# Altium schematic symbol library SparkFun-Aesthetics.SCHLIB: 129 symbols (continued)
## SFE_LOGO_FLAME.2COP (continued)
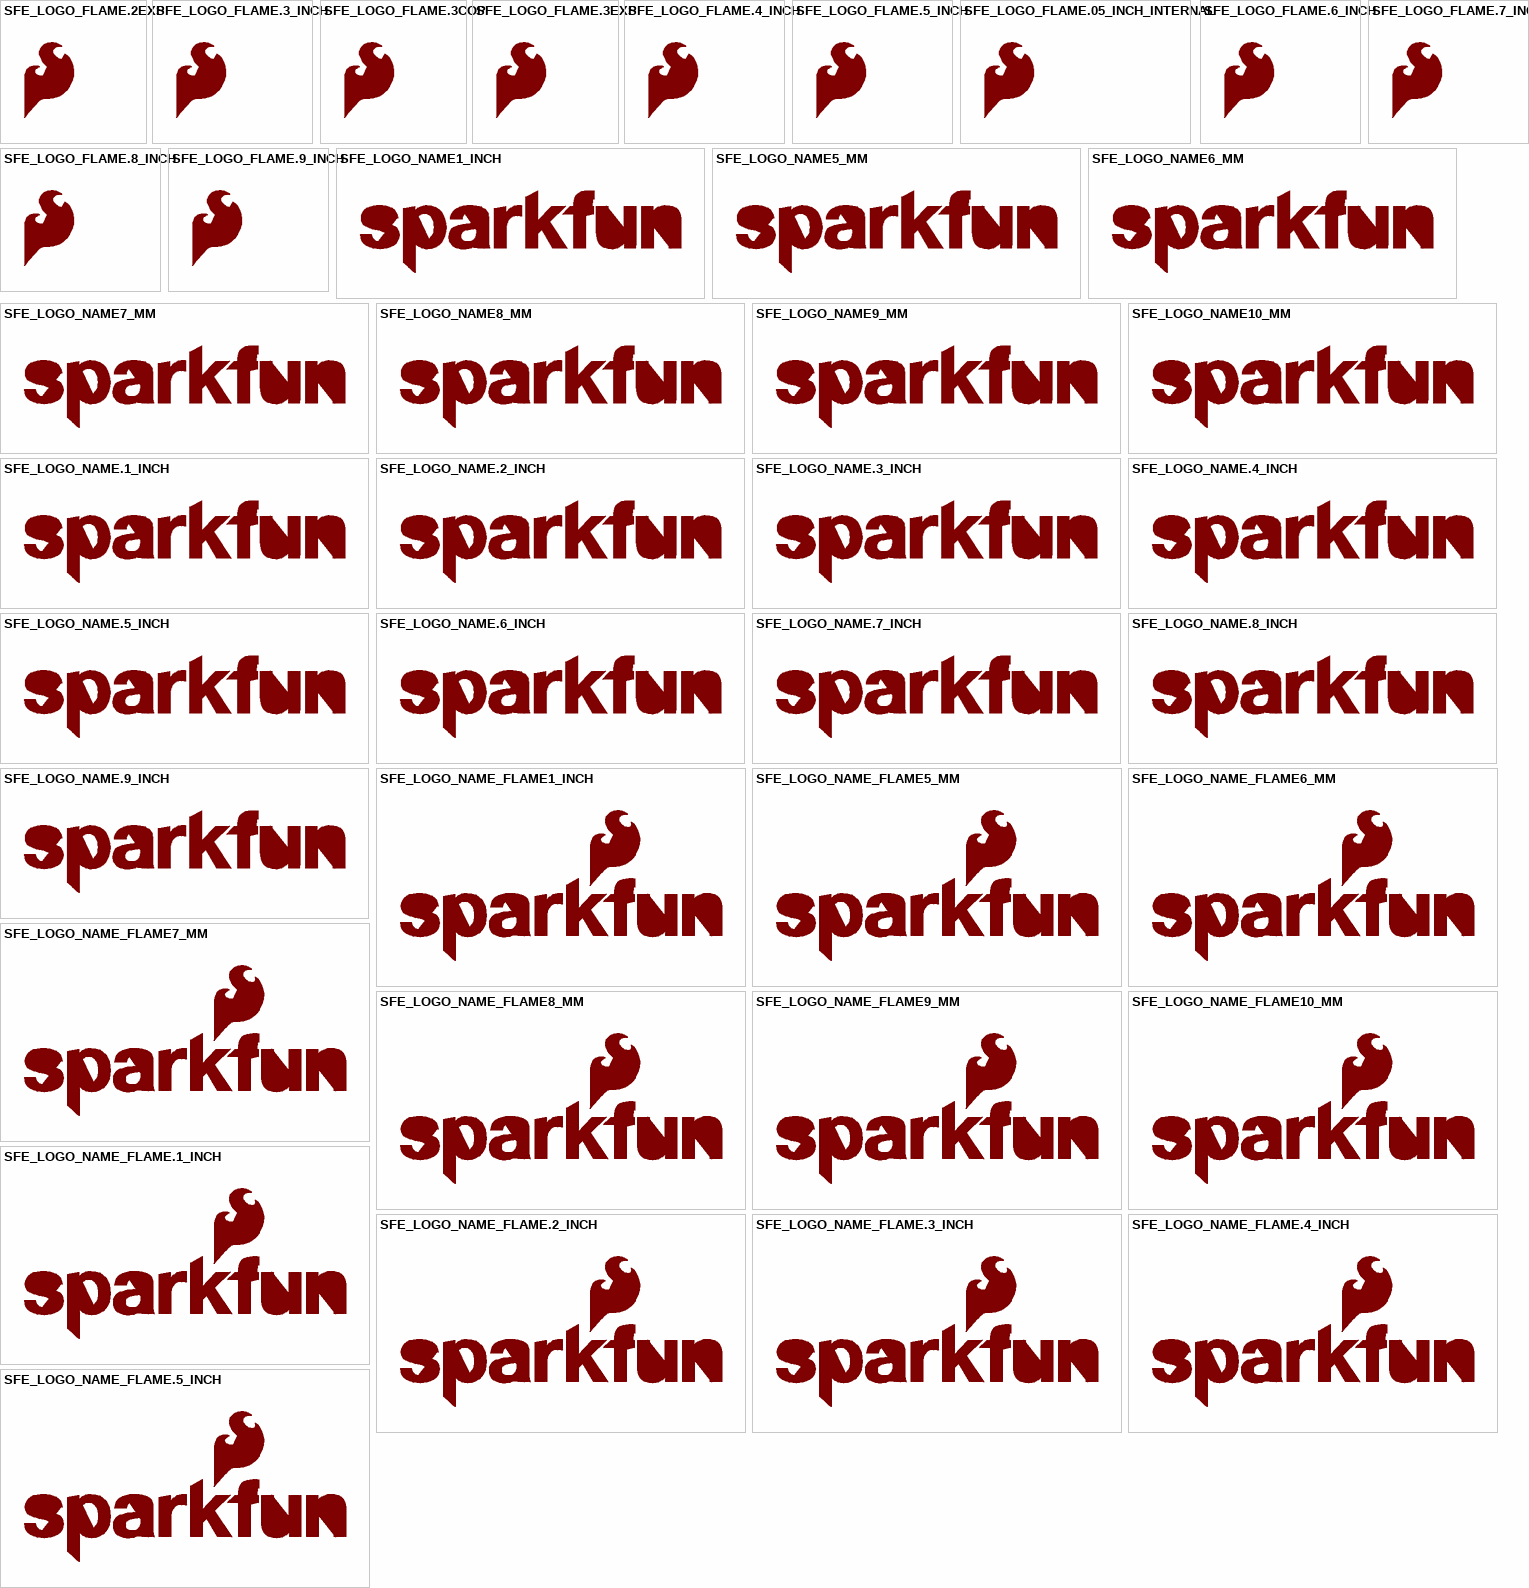
[diagram p10: symbols SFE_LOGO_FLAME.2EXP to SFE_LOGO_NAME_FLAME.5_INCH]

## SFE_LOGO_FLAME.2EXP
designator LOGO?, comment SparkFun Flame Logo    This is the SparkFun flame logo. The logo on the schematic will always be the same size; the package variant is the height of the flame. Default layer for the logo on the board is tSilk.  (value not drawn)
GateName_1: G$1; SymbolName_1: SFE_LOGO_FLAME; DeviceName: .2EXP; LibraryName: SparkFun-Aesthetics; DeviceSetName: SFE_LOGO_FLAME; Package: SFE_LOGO_FLAME_COPPER_EXPOSED_.2
footprint SFE_LOGO_FLAME_COPPER_EXPOSED_.2

## SFE_LOGO_FLAME.3_INCH
designator LOGO?, comment SparkFun Flame Logo    This is the SparkFun flame logo. The logo on the schematic will always be the same size; the package variant is the height of the flame. Default layer for the logo on the board is tSilk.  (value not drawn)
GateName_1: G$1; SymbolName_1: SFE_LOGO_FLAME; DeviceName: .3_INCH; LibraryName: SparkFun-Aesthetics; DeviceSetName: SFE_LOGO_FLAME; Package: SFE_LOGO_FLAME_.3
footprint SFE_LOGO_FLAME_.3

## SFE_LOGO_FLAME.3COP
designator LOGO?, comment SparkFun Flame Logo    This is the SparkFun flame logo. The logo on the schematic will always be the same size; the package variant is the height of the flame. Default layer for the logo on the board is tSilk.  (value not drawn)
GateName_1: G$1; SymbolName_1: SFE_LOGO_FLAME; DeviceName: .3COP; LibraryName: SparkFun-Aesthetics; DeviceSetName: SFE_LOGO_FLAME; Package: SFE_LOGO_FLAME_COPPER_.3
footprint SFE_LOGO_FLAME_COPPER_.3

## SFE_LOGO_FLAME.3EXP
designator LOGO?, comment SparkFun Flame Logo    This is the SparkFun flame logo. The logo on the schematic will always be the same size; the package variant is the height of the flame. Default layer for the logo on the board is tSilk.  (value not drawn)
GateName_1: G$1; SymbolName_1: SFE_LOGO_FLAME; DeviceName: .3EXP; LibraryName: SparkFun-Aesthetics; DeviceSetName: SFE_LOGO_FLAME; Package: SFE_LOGO_FLAME_COPPER_EXPOSED_.3
footprint SFE_LOGO_FLAME_COPPER_EXPOSED_.3

## SFE_LOGO_FLAME.4_INCH
designator LOGO?, comment SparkFun Flame Logo    This is the SparkFun flame logo. The logo on the schematic will always be the same size; the package variant is the height of the flame. Default layer for the logo on the board is tSilk.  (value not drawn)
GateName_1: G$1; SymbolName_1: SFE_LOGO_FLAME; DeviceName: .4_INCH; LibraryName: SparkFun-Aesthetics; DeviceSetName: SFE_LOGO_FLAME; Package: SFE_LOGO_FLAME_.4
footprint SFE_LOGO_FLAME_.4

## SFE_LOGO_FLAME.5_INCH
designator LOGO?, comment SparkFun Flame Logo    This is the SparkFun flame logo. The logo on the schematic will always be the same size; the package variant is the height of the flame. Default layer for the logo on the board is tSilk.  (value not drawn)
GateName_1: G$1; SymbolName_1: SFE_LOGO_FLAME; DeviceName: .5_INCH; LibraryName: SparkFun-Aesthetics; DeviceSetName: SFE_LOGO_FLAME; Package: SFE_LOGO_FLAME_.5
footprint SFE_LOGO_FLAME_.5

## SFE_LOGO_FLAME.05_INCH_INTERNAL
designator LOGO?, comment SparkFun Flame Logo    This is the SparkFun flame logo. The logo on the schematic will always be the same size; the package variant is the height of the flame. Default layer for the logo on the board is tSilk.  (value not drawn)
GateName_1: G$1; SymbolName_1: SFE_LOGO_FLAME; DeviceName: .05_INCH_INTERNAL; LibraryName: SparkFun-Aesthetics; DeviceSetName: SFE_LOGO_FLAME; Package: SFE_LOGO_FLAME_INTERNAL_0.05
footprint SFE_LOGO_FLAME_INTERNAL_0.05

## SFE_LOGO_FLAME.6_INCH
designator LOGO?, comment SparkFun Flame Logo    This is the SparkFun flame logo. The logo on the schematic will always be the same size; the package variant is the height of the flame. Default layer for the logo on the board is tSilk.  (value not drawn)
GateName_1: G$1; SymbolName_1: SFE_LOGO_FLAME; DeviceName: .6_INCH; LibraryName: SparkFun-Aesthetics; DeviceSetName: SFE_LOGO_FLAME; Package: SFE_LOGO_FLAME_.6
footprint SFE_LOGO_FLAME_.6

## SFE_LOGO_FLAME.7_INCH
designator LOGO?, comment SparkFun Flame Logo    This is the SparkFun flame logo. The logo on the schematic will always be the same size; the package variant is the height of the flame. Default layer for the logo on the board is tSilk.  (value not drawn)
GateName_1: G$1; SymbolName_1: SFE_LOGO_FLAME; DeviceName: .7_INCH; LibraryName: SparkFun-Aesthetics; DeviceSetName: SFE_LOGO_FLAME; Package: SFE_LOGO_FLAME_.7
footprint SFE_LOGO_FLAME_.7

## SFE_LOGO_FLAME.8_INCH
designator LOGO?, comment SparkFun Flame Logo    This is the SparkFun flame logo. The logo on the schematic will always be the same size; the package variant is the height of the flame. Default layer for the logo on the board is tSilk.  (value not drawn)
GateName_1: G$1; SymbolName_1: SFE_LOGO_FLAME; DeviceName: .8_INCH; LibraryName: SparkFun-Aesthetics; DeviceSetName: SFE_LOGO_FLAME; Package: SFE_LOGO_FLAME_.8
footprint SFE_LOGO_FLAME_.8

## SFE_LOGO_FLAME.9_INCH
designator LOGO?, comment SparkFun Flame Logo    This is the SparkFun flame logo. The logo on the schematic will always be the same size; the package variant is the height of the flame. Default layer for the logo on the board is tSilk.  (value not drawn)
GateName_1: G$1; SymbolName_1: SFE_LOGO_FLAME; DeviceName: .9_INCH; LibraryName: SparkFun-Aesthetics; DeviceSetName: SFE_LOGO_FLAME; Package: SFE_LOGO_FLAME_.9
footprint SFE_LOGO_FLAME_.9

## SFE_LOGO_NAME1_INCH
designator LOGO?, comment SparkFun Font Logo    This is the SparkFun name logo. The logo on the schematic will always be the same size; the package variant is the height of the flame part of the logo (or the height the flame would be, if it were drawn). Default layer for the logo on the board is tSilk.  (value not drawn)
GateName_1: G$1; SymbolName_1: SFE_LOGO_NAME; DeviceName: 1_INCH; LibraryName: SparkFun-Aesthetics; DeviceSetName: SFE_LOGO_NAME; Package: SFE_LOGO_NAME_1
footprint SFE_LOGO_NAME_1

## SFE_LOGO_NAME5_MM
designator LOGO?, comment SparkFun Font Logo    This is the SparkFun name logo. The logo on the schematic will always be the same size; the package variant is the height of the flame part of the logo (or the height the flame would be, if it were drawn). Default layer for the logo on the board is tSilk.  (value not drawn)
GateName_1: G$1; SymbolName_1: SFE_LOGO_NAME; DeviceName: 5_MM; LibraryName: SparkFun-Aesthetics; DeviceSetName: SFE_LOGO_NAME; Package: SFE_LOGO_NAME_5MM
footprint SFE_LOGO_NAME_5MM

## SFE_LOGO_NAME6_MM
designator LOGO?, comment SparkFun Font Logo    This is the SparkFun name logo. The logo on the schematic will always be the same size; the package variant is the height of the flame part of the logo (or the height the flame would be, if it were drawn). Default layer for the logo on the board is tSilk.  (value not drawn)
GateName_1: G$1; SymbolName_1: SFE_LOGO_NAME; DeviceName: 6_MM; LibraryName: SparkFun-Aesthetics; DeviceSetName: SFE_LOGO_NAME; Package: SFE_LOGO_NAME_6MM
footprint SFE_LOGO_NAME_6MM

## SFE_LOGO_NAME7_MM
designator LOGO?, comment SparkFun Font Logo    This is the SparkFun name logo. The logo on the schematic will always be the same size; the package variant is the height of the flame part of the logo (or the height the flame would be, if it were drawn). Default layer for the logo on the board is tSilk.  (value not drawn)
GateName_1: G$1; SymbolName_1: SFE_LOGO_NAME; DeviceName: 7_MM; LibraryName: SparkFun-Aesthetics; DeviceSetName: SFE_LOGO_NAME; Package: SFE_LOGO_NAME_7MM
footprint SFE_LOGO_NAME_7MM

## SFE_LOGO_NAME8_MM
designator LOGO?, comment SparkFun Font Logo    This is the SparkFun name logo. The logo on the schematic will always be the same size; the package variant is the height of the flame part of the logo (or the height the flame would be, if it were drawn). Default layer for the logo on the board is tSilk.  (value not drawn)
GateName_1: G$1; SymbolName_1: SFE_LOGO_NAME; DeviceName: 8_MM; LibraryName: SparkFun-Aesthetics; DeviceSetName: SFE_LOGO_NAME; Package: SFE_LOGO_NAME_8MM
footprint SFE_LOGO_NAME_8MM

## SFE_LOGO_NAME9_MM
designator LOGO?, comment SparkFun Font Logo    This is the SparkFun name logo. The logo on the schematic will always be the same size; the package variant is the height of the flame part of the logo (or the height the flame would be, if it were drawn). Default layer for the logo on the board is tSilk.  (value not drawn)
GateName_1: G$1; SymbolName_1: SFE_LOGO_NAME; DeviceName: 9_MM; LibraryName: SparkFun-Aesthetics; DeviceSetName: SFE_LOGO_NAME; Package: SFE_LOGO_NAME_9MM
footprint SFE_LOGO_NAME_9MM

## SFE_LOGO_NAME10_MM
designator LOGO?, comment SparkFun Font Logo    This is the SparkFun name logo. The logo on the schematic will always be the same size; the package variant is the height of the flame part of the logo (or the height the flame would be, if it were drawn). Default layer for the logo on the board is tSilk.  (value not drawn)
GateName_1: G$1; SymbolName_1: SFE_LOGO_NAME; DeviceName: 10_MM; LibraryName: SparkFun-Aesthetics; DeviceSetName: SFE_LOGO_NAME; Package: SFE_LOGO_NAME_10MM
footprint SFE_LOGO_NAME_10MM

## SFE_LOGO_NAME.1_INCH
designator LOGO?, comment SparkFun Font Logo    This is the SparkFun name logo. The logo on the schematic will always be the same size; the package variant is the height of the flame part of the logo (or the height the flame would be, if it were drawn). Default layer for the logo on the board is tSilk.  (value not drawn)
GateName_1: G$1; SymbolName_1: SFE_LOGO_NAME; DeviceName: .1_INCH; LibraryName: SparkFun-Aesthetics; DeviceSetName: SFE_LOGO_NAME; Package: SFE_LOGO_NAME_.1
footprint SFE_LOGO_NAME_.1

## SFE_LOGO_NAME.2_INCH
designator LOGO?, comment SparkFun Font Logo    This is the SparkFun name logo. The logo on the schematic will always be the same size; the package variant is the height of the flame part of the logo (or the height the flame would be, if it were drawn). Default layer for the logo on the board is tSilk.  (value not drawn)
GateName_1: G$1; SymbolName_1: SFE_LOGO_NAME; DeviceName: .2_INCH; LibraryName: SparkFun-Aesthetics; DeviceSetName: SFE_LOGO_NAME; Package: SFE_LOGO_NAME_.2
footprint SFE_LOGO_NAME_.2

## SFE_LOGO_NAME.3_INCH
designator LOGO?, comment SparkFun Font Logo    This is the SparkFun name logo. The logo on the schematic will always be the same size; the package variant is the height of the flame part of the logo (or the height the flame would be, if it were drawn). Default layer for the logo on the board is tSilk.  (value not drawn)
GateName_1: G$1; SymbolName_1: SFE_LOGO_NAME; DeviceName: .3_INCH; LibraryName: SparkFun-Aesthetics; DeviceSetName: SFE_LOGO_NAME; Package: SFE_LOGO_NAME_.3
footprint SFE_LOGO_NAME_.3

## SFE_LOGO_NAME.4_INCH
designator LOGO?, comment SparkFun Font Logo    This is the SparkFun name logo. The logo on the schematic will always be the same size; the package variant is the height of the flame part of the logo (or the height the flame would be, if it were drawn). Default layer for the logo on the board is tSilk.  (value not drawn)
GateName_1: G$1; SymbolName_1: SFE_LOGO_NAME; DeviceName: .4_INCH; LibraryName: SparkFun-Aesthetics; DeviceSetName: SFE_LOGO_NAME; Package: SFE_LOGO_NAME_.4
footprint SFE_LOGO_NAME_.4

## SFE_LOGO_NAME.5_INCH
designator LOGO?, comment SparkFun Font Logo    This is the SparkFun name logo. The logo on the schematic will always be the same size; the package variant is the height of the flame part of the logo (or the height the flame would be, if it were drawn). Default layer for the logo on the board is tSilk.  (value not drawn)
GateName_1: G$1; SymbolName_1: SFE_LOGO_NAME; DeviceName: .5_INCH; LibraryName: SparkFun-Aesthetics; DeviceSetName: SFE_LOGO_NAME; Package: SFE_LOGO_NAME_.5
footprint SFE_LOGO_NAME_.5

## SFE_LOGO_NAME.6_INCH
designator LOGO?, comment SparkFun Font Logo    This is the SparkFun name logo. The logo on the schematic will always be the same size; the package variant is the height of the flame part of the logo (or the height the flame would be, if it were drawn). Default layer for the logo on the board is tSilk.  (value not drawn)
GateName_1: G$1; SymbolName_1: SFE_LOGO_NAME; DeviceName: .6_INCH; LibraryName: SparkFun-Aesthetics; DeviceSetName: SFE_LOGO_NAME; Package: SFE_LOGO_NAME_.6
footprint SFE_LOGO_NAME_.6

## SFE_LOGO_NAME.7_INCH
designator LOGO?, comment SparkFun Font Logo    This is the SparkFun name logo. The logo on the schematic will always be the same size; the package variant is the height of the flame part of the logo (or the height the flame would be, if it were drawn). Default layer for the logo on the board is tSilk.  (value not drawn)
GateName_1: G$1; SymbolName_1: SFE_LOGO_NAME; DeviceName: .7_INCH; LibraryName: SparkFun-Aesthetics; DeviceSetName: SFE_LOGO_NAME; Package: SFE_LOGO_NAME_.7
footprint SFE_LOGO_NAME_.7

## SFE_LOGO_NAME.8_INCH
designator LOGO?, comment SparkFun Font Logo    This is the SparkFun name logo. The logo on the schematic will always be the same size; the package variant is the height of the flame part of the logo (or the height the flame would be, if it were drawn). Default layer for the logo on the board is tSilk.  (value not drawn)
GateName_1: G$1; SymbolName_1: SFE_LOGO_NAME; DeviceName: .8_INCH; LibraryName: SparkFun-Aesthetics; DeviceSetName: SFE_LOGO_NAME; Package: SFE_LOGO_NAME_.8
footprint SFE_LOGO_NAME_.8

## SFE_LOGO_NAME.9_INCH
designator LOGO?, comment SparkFun Font Logo    This is the SparkFun name logo. The logo on the schematic will always be the same size; the package variant is the height of the flame part of the logo (or the height the flame would be, if it were drawn). Default layer for the logo on the board is tSilk.  (value not drawn)
GateName_1: G$1; SymbolName_1: SFE_LOGO_NAME; DeviceName: .9_INCH; LibraryName: SparkFun-Aesthetics; DeviceSetName: SFE_LOGO_NAME; Package: SFE_LOGO_NAME_.9
footprint SFE_LOGO_NAME_.9

## SFE_LOGO_NAME_FLAME1_INCH
designator LOGO?, comment SparkFun Font Logo w/ Flame    This is the SparkFun full logo. The logo on the schematic will always be the same size; the package variant is the height of the flame part of the logo. Default layer for the logo on the board is tSilk.  (value not drawn)
GateName_1: G$1; SymbolName_1: SFE_LOGO_NAME_FLAME; DeviceName: 1_INCH; LibraryName: SparkFun-Aesthetics; DeviceSetName: SFE_LOGO_NAME_FLAME; Package: SFE_LOGO_NAME_FLAME_1
footprint SFE_LOGO_NAME_FLAME_1

## SFE_LOGO_NAME_FLAME5_MM
designator LOGO?, comment SparkFun Font Logo w/ Flame    This is the SparkFun full logo. The logo on the schematic will always be the same size; the package variant is the height of the flame part of the logo. Default layer for the logo on the board is tSilk.  (value not drawn)
GateName_1: G$1; SymbolName_1: SFE_LOGO_NAME_FLAME; DeviceName: 5_MM; LibraryName: SparkFun-Aesthetics; DeviceSetName: SFE_LOGO_NAME_FLAME; Package: SFE_LOGO_NAME_FLAME_5MM
footprint SFE_LOGO_NAME_FLAME_5MM

## SFE_LOGO_NAME_FLAME6_MM
designator LOGO?, comment SparkFun Font Logo w/ Flame    This is the SparkFun full logo. The logo on the schematic will always be the same size; the package variant is the height of the flame part of the logo. Default layer for the logo on the board is tSilk.  (value not drawn)
GateName_1: G$1; SymbolName_1: SFE_LOGO_NAME_FLAME; DeviceName: 6_MM; LibraryName: SparkFun-Aesthetics; DeviceSetName: SFE_LOGO_NAME_FLAME; Package: SFE_LOGO_NAME_FLAME_6MM
footprint SFE_LOGO_NAME_FLAME_6MM

## SFE_LOGO_NAME_FLAME7_MM
designator LOGO?, comment SparkFun Font Logo w/ Flame    This is the SparkFun full logo. The logo on the schematic will always be the same size; the package variant is the height of the flame part of the logo. Default layer for the logo on the board is tSilk.  (value not drawn)
GateName_1: G$1; SymbolName_1: SFE_LOGO_NAME_FLAME; DeviceName: 7_MM; LibraryName: SparkFun-Aesthetics; DeviceSetName: SFE_LOGO_NAME_FLAME; Package: SFE_LOGO_NAME_FLAME_7MM
footprint SFE_LOGO_NAME_FLAME_7MM

## SFE_LOGO_NAME_FLAME8_MM
designator LOGO?, comment SparkFun Font Logo w/ Flame    This is the SparkFun full logo. The logo on the schematic will always be the same size; the package variant is the height of the flame part of the logo. Default layer for the logo on the board is tSilk.  (value not drawn)
GateName_1: G$1; SymbolName_1: SFE_LOGO_NAME_FLAME; DeviceName: 8_MM; LibraryName: SparkFun-Aesthetics; DeviceSetName: SFE_LOGO_NAME_FLAME; Package: SFE_LOGO_NAME_FLAME_8MM
footprint SFE_LOGO_NAME_FLAME_8MM

## SFE_LOGO_NAME_FLAME9_MM
designator LOGO?, comment SparkFun Font Logo w/ Flame    This is the SparkFun full logo. The logo on the schematic will always be the same size; the package variant is the height of the flame part of the logo. Default layer for the logo on the board is tSilk.  (value not drawn)
GateName_1: G$1; SymbolName_1: SFE_LOGO_NAME_FLAME; DeviceName: 9_MM; LibraryName: SparkFun-Aesthetics; DeviceSetName: SFE_LOGO_NAME_FLAME; Package: SFE_LOGO_NAME_FLAME_9MM
footprint SFE_LOGO_NAME_FLAME_9MM

## SFE_LOGO_NAME_FLAME10_MM
designator LOGO?, comment SparkFun Font Logo w/ Flame    This is the SparkFun full logo. The logo on the schematic will always be the same size; the package variant is the height of the flame part of the logo. Default layer for the logo on the board is tSilk.  (value not drawn)
GateName_1: G$1; SymbolName_1: SFE_LOGO_NAME_FLAME; DeviceName: 10_MM; LibraryName: SparkFun-Aesthetics; DeviceSetName: SFE_LOGO_NAME_FLAME; Package: SFE_LOGO_NAME_FLAME_10MM
footprint SFE_LOGO_NAME_FLAME_10MM

## SFE_LOGO_NAME_FLAME.1_INCH
designator LOGO?, comment SparkFun Font Logo w/ Flame    This is the SparkFun full logo. The logo on the schematic will always be the same size; the package variant is the height of the flame part of the logo. Default layer for the logo on the board is tSilk.  (value not drawn)
GateName_1: G$1; SymbolName_1: SFE_LOGO_NAME_FLAME; DeviceName: .1_INCH; LibraryName: SparkFun-Aesthetics; DeviceSetName: SFE_LOGO_NAME_FLAME; Package: SFE_LOGO_NAME_FLAME_.1
footprint SFE_LOGO_NAME_FLAME_.1

## SFE_LOGO_NAME_FLAME.2_INCH
designator LOGO?, comment SparkFun Font Logo w/ Flame    This is the SparkFun full logo. The logo on the schematic will always be the same size; the package variant is the height of the flame part of the logo. Default layer for the logo on the board is tSilk.  (value not drawn)
GateName_1: G$1; SymbolName_1: SFE_LOGO_NAME_FLAME; DeviceName: .2_INCH; LibraryName: SparkFun-Aesthetics; DeviceSetName: SFE_LOGO_NAME_FLAME; Package: SFE_LOGO_NAME_FLAME_.2
footprint SFE_LOGO_NAME_FLAME_.2

## SFE_LOGO_NAME_FLAME.3_INCH
designator LOGO?, comment SparkFun Font Logo w/ Flame    This is the SparkFun full logo. The logo on the schematic will always be the same size; the package variant is the height of the flame part of the logo. Default layer for the logo on the board is tSilk.  (value not drawn)
GateName_1: G$1; SymbolName_1: SFE_LOGO_NAME_FLAME; DeviceName: .3_INCH; LibraryName: SparkFun-Aesthetics; DeviceSetName: SFE_LOGO_NAME_FLAME; Package: SFE_LOGO_NAME_FLAME_.3
footprint SFE_LOGO_NAME_FLAME_.3

## SFE_LOGO_NAME_FLAME.4_INCH
designator LOGO?, comment SparkFun Font Logo w/ Flame    This is the SparkFun full logo. The logo on the schematic will always be the same size; the package variant is the height of the flame part of the logo. Default layer for the logo on the board is tSilk.  (value not drawn)
GateName_1: G$1; SymbolName_1: SFE_LOGO_NAME_FLAME; DeviceName: .4_INCH; LibraryName: SparkFun-Aesthetics; DeviceSetName: SFE_LOGO_NAME_FLAME; Package: SFE_LOGO_NAME_FLAME_.4
footprint SFE_LOGO_NAME_FLAME_.4

## SFE_LOGO_NAME_FLAME.5_INCH
designator LOGO?, comment SparkFun Font Logo w/ Flame    This is the SparkFun full logo. The logo on the schematic will always be the same size; the package variant is the height of the flame part of the logo. Default layer for the logo on the board is tSilk.  (value not drawn)
GateName_1: G$1; SymbolName_1: SFE_LOGO_NAME_FLAME; DeviceName: .5_INCH; LibraryName: SparkFun-Aesthetics; DeviceSetName: SFE_LOGO_NAME_FLAME; Package: SFE_LOGO_NAME_FLAME_.5
footprint SFE_LOGO_NAME_FLAME_.5

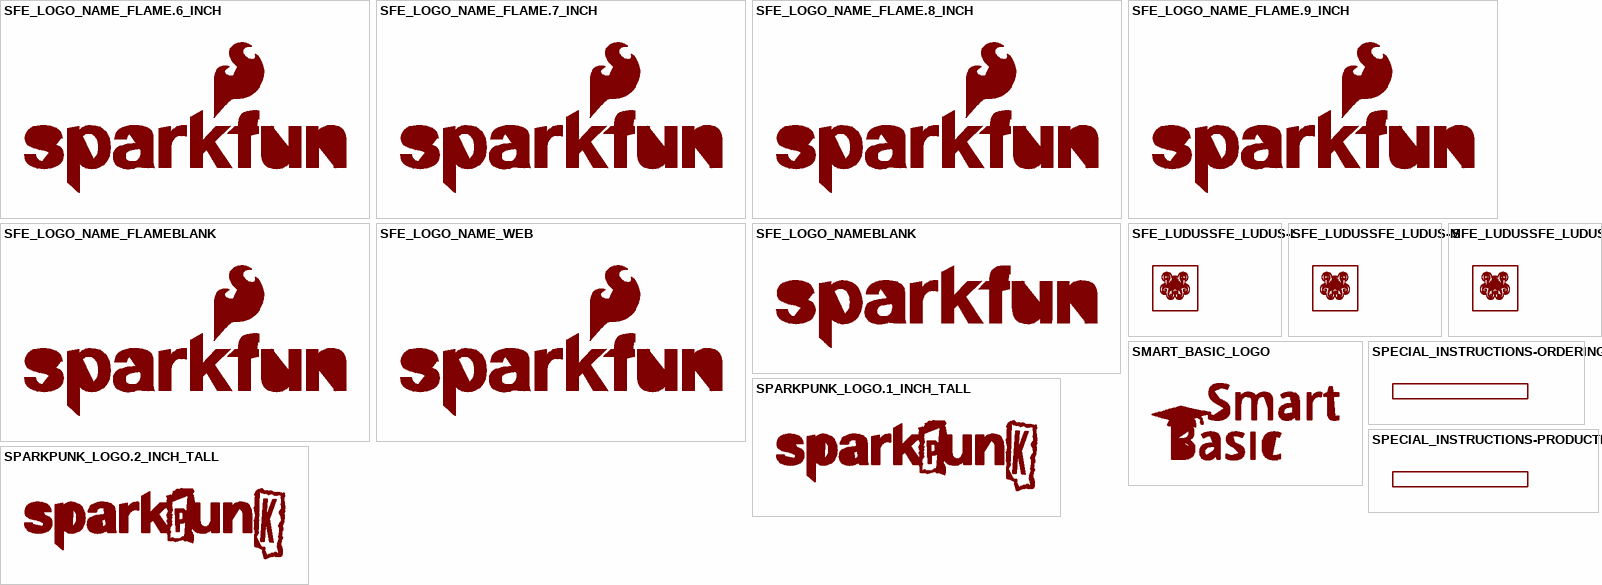
[diagram p11: symbols SFE_LOGO_NAME_FLAME.6_INCH to SPECIAL_INSTRUCTIONS-PRODUCTION]

## SFE_LOGO_NAME_FLAME.6_INCH
designator LOGO?, comment SparkFun Font Logo w/ Flame    This is the SparkFun full logo. The logo on the schematic will always be the same size; the package variant is the height of the flame part of the logo. Default layer for the logo on the board is tSilk.  (value not drawn)
GateName_1: G$1; SymbolName_1: SFE_LOGO_NAME_FLAME; DeviceName: .6_INCH; LibraryName: SparkFun-Aesthetics; DeviceSetName: SFE_LOGO_NAME_FLAME; Package: SFE_LOGO_NAME_FLAME_.6
footprint SFE_LOGO_NAME_FLAME_.6

## SFE_LOGO_NAME_FLAME.7_INCH
designator LOGO?, comment SparkFun Font Logo w/ Flame    This is the SparkFun full logo. The logo on the schematic will always be the same size; the package variant is the height of the flame part of the logo. Default layer for the logo on the board is tSilk.  (value not drawn)
GateName_1: G$1; SymbolName_1: SFE_LOGO_NAME_FLAME; DeviceName: .7_INCH; LibraryName: SparkFun-Aesthetics; DeviceSetName: SFE_LOGO_NAME_FLAME; Package: SFE_LOGO_NAME_FLAME_.7
footprint SFE_LOGO_NAME_FLAME_.7

## SFE_LOGO_NAME_FLAME.8_INCH
designator LOGO?, comment SparkFun Font Logo w/ Flame    This is the SparkFun full logo. The logo on the schematic will always be the same size; the package variant is the height of the flame part of the logo. Default layer for the logo on the board is tSilk.  (value not drawn)
GateName_1: G$1; SymbolName_1: SFE_LOGO_NAME_FLAME; DeviceName: .8_INCH; LibraryName: SparkFun-Aesthetics; DeviceSetName: SFE_LOGO_NAME_FLAME; Package: SFE_LOGO_NAME_FLAME_.8
footprint SFE_LOGO_NAME_FLAME_.8

## SFE_LOGO_NAME_FLAME.9_INCH
designator LOGO?, comment SparkFun Font Logo w/ Flame    This is the SparkFun full logo. The logo on the schematic will always be the same size; the package variant is the height of the flame part of the logo. Default layer for the logo on the board is tSilk.  (value not drawn)
GateName_1: G$1; SymbolName_1: SFE_LOGO_NAME_FLAME; DeviceName: .9_INCH; LibraryName: SparkFun-Aesthetics; DeviceSetName: SFE_LOGO_NAME_FLAME; Package: SFE_LOGO_NAME_FLAME_.9
footprint SFE_LOGO_NAME_FLAME_.9

## SFE_LOGO_NAME_FLAMEBLANK
designator LOGO?, comment SparkFun Font Logo w/ Flame    This is the SparkFun full logo. The logo on the schematic will always be the same size; the package variant is the height of the flame part of the logo. Default layer for the logo on the board is tSilk.  (value not drawn)
GateName_1: G$1; SymbolName_1: SFE_LOGO_NAME_FLAME; DeviceName: BLANK; LibraryName: SparkFun-Aesthetics; DeviceSetName: SFE_LOGO_NAME_FLAME; Package: BLANK
footprint BLANK

## SFE_LOGO_NAME_WEB
designator LOGO?, comment SparkFun Logo w/ ".com" and Flame    SparkFun-font w/ flame and ".com"  (value not drawn)
GateName_1: G$1; SymbolName_1: SFE_LOGO_NAME_FLAME; DeviceSetName: SFE_LOGO_NAME_WEB; LibraryName: SparkFun-Aesthetics; Package: SFE_LOGO_NAME_WEB
footprint SFE_LOGO_NAME_WEB

## SFE_LOGO_NAMEBLANK
designator LOGO?, comment SparkFun Font Logo    This is the SparkFun name logo. The logo on the schematic will always be the same size; the package variant is the height of the flame part of the logo (or the height the flame would be, if it were drawn). Default layer for the logo on the board is tSilk.  (value not drawn)
GateName_1: G$1; SymbolName_1: SFE_LOGO_NAME; DeviceName: BLANK; LibraryName: SparkFun-Aesthetics; DeviceSetName: SFE_LOGO_NAME; Package: BLANK
footprint BLANK

## SFE_LUDUSSFE_LUDUS-L
designator LOGO?, comment SparkFun Education Mascot - Ludus! - Silkscreen    Ludus logo for SparkFun Education products.  (value not drawn)
GateName_1: G$1; SymbolName_1: SFE_LUDUS_LOGO; DeviceName: SFE_LUDUS-L; DeviceSetName: SFE_LUDUS; LibraryName: SparkFun-Aesthetics; Package: SFE_LUDUS-L
footprint SFE_LUDUS-L

## SFE_LUDUSSFE_LUDUS-M
designator LOGO?, comment SparkFun Education Mascot - Ludus! - Silkscreen    Ludus logo for SparkFun Education products.  (value not drawn)
GateName_1: G$1; SymbolName_1: SFE_LUDUS_LOGO; DeviceName: SFE_LUDUS-M; DeviceSetName: SFE_LUDUS; LibraryName: SparkFun-Aesthetics; Package: SFE_LUDUS-M
footprint SFE_LUDUS-M

## SFE_LUDUSSFE_LUDUS-S
designator LOGO?, comment SparkFun Education Mascot - Ludus! - Silkscreen    Ludus logo for SparkFun Education products.  (value not drawn)
GateName_1: G$1; SymbolName_1: SFE_LUDUS_LOGO; DeviceName: SFE_LUDUS-S; DeviceSetName: SFE_LUDUS; LibraryName: SparkFun-Aesthetics; Package: SFE_LUDUS-S
footprint SFE_LUDUS-S

## SMART_BASIC_LOGO
designator LOGO?, comment SparkFun Smart Basic Logo - Silkscreen    Silkscreen logo for SparkFun FTDI SmartBasic.  (value not drawn)
GateName_1: G$1; SymbolName_1: SMART_BASIC_LOGO; LibraryName: SparkFun-Aesthetics; DeviceSetName: SMART_BASIC_LOGO; Package: SMART_BASIC_LOGO
footprint SMART_BASIC_LOGO

## SPARKPUNK_LOGO.1_INCH_TALL
designator LOGO?, comment SparkPunk Logo - Silkscreen    Silkscreen logo used on the SparkFun SparkPunk Sound Kit and SparkFun SparkPunk Sequencer Kit.  (value not drawn)
GateName_1: G$1; SymbolName_1: SPARKPUNK_LOGO; DeviceName: .1_INCH_TALL; LibraryName: SparkFun-Aesthetics; DeviceSetName: SPARKPUNK_LOGO; Package: SPARKPUNK_LOGO_.1
footprint SPARKPUNK_LOGO_.1

## SPARKPUNK_LOGO.2_INCH_TALL
designator LOGO?, comment SparkPunk Logo - Silkscreen    Silkscreen logo used on the SparkFun SparkPunk Sound Kit and SparkFun SparkPunk Sequencer Kit.  (value not drawn)
GateName_1: G$1; SymbolName_1: SPARKPUNK_LOGO; DeviceName: .2_INCH_TALL; LibraryName: SparkFun-Aesthetics; DeviceSetName: SPARKPUNK_LOGO; Package: SPARKPUNK_LOGO_.2
footprint SPARKPUNK_LOGO_.2

## SPECIAL_INSTRUCTIONS-ORDERING
designator LOGO?, comment Special Ordering/Production Instructions Alert    Symbol for special PCB ordering instructions or unique production process warnings.      Ordering InstructionsProduction Instructions      Types of information that should be added to box: Copper weight  Soldermask color  Silk color  PCB thickness  Number of layers       PCB Standard: 1.6mm FR4  1 oz copper  immersion silver plating  red soldermask  white silkscreen    	   Types of information that should be added to box: Special wash requirements  Depaneling instructions  Humidification  Glue curing    	   Default text settings: 0.07 inch  9% ratio  50% line distance  (value not drawn)
GateName_1: G$1; SymbolName_1: SPECIAL_INSTRUCTIONS; DeviceName: -ORDERING; LibraryName: SparkFun-Aesthetics; DeviceSetName: SPECIAL_INSTRUCTIONS; Package: ORDERING_INSTRUCTIONS
footprint ORDERING_INSTRUCTIONS

## SPECIAL_INSTRUCTIONS-PRODUCTION
designator LOGO?, comment Special Ordering/Production Instructions Alert    Symbol for special PCB ordering instructions or unique production process warnings.      Ordering InstructionsProduction Instructions      Types of information that should be added to box: Copper weight  Soldermask color  Silk color  PCB thickness  Number of layers       PCB Standard: 1.6mm FR4  1 oz copper  immersion silver plating  red soldermask  white silkscreen    	   Types of information that should be added to box: Special wash requirements  Depaneling instructions  Humidification  Glue curing    	   Default text settings: 0.07 inch  9% ratio  50% line distance  (value not drawn)
GateName_1: G$1; SymbolName_1: SPECIAL_INSTRUCTIONS; DeviceName: -PRODUCTION; LibraryName: SparkFun-Aesthetics; DeviceSetName: SPECIAL_INSTRUCTIONS; Package: PRODUCTION_INSTRUCTIONS
footprint PRODUCTION_INSTRUCTIONS